# Altium footprint library master.PcbLib: 98 footprints (part 7 of 7)
Each footprint in its own frame and in the unit in brackets; x right, y up, seen from the top. Pads: shape width x height; smd on the part's side, far side on the other; paste and mask are expansions set on the pad; w line width, h text height; cw(c..) or ccw(c..) is an arc to the next point about the centre after c.
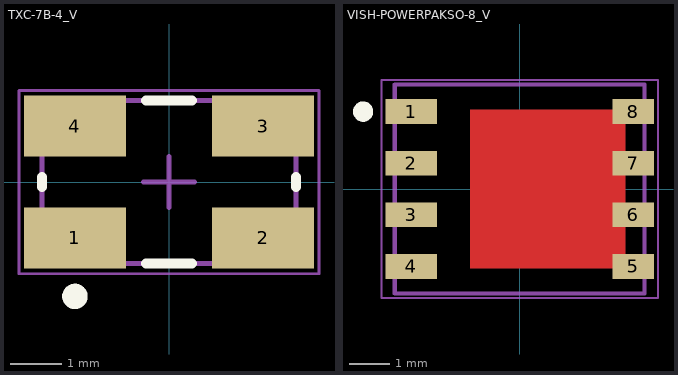
[diagram p6: the footprints below, top view; thin cyan lines are the x and y axes]

## TXC-7B-4_V [mm] "SMD, 4-Leads, Body 5x3.2mm, Pitch 3.7mm"
height 1.05
pads (4):
  rect 2x1.2 smd: 1(-1.85,-1.1) 2(1.85,-1.1) 3(1.85,1.1) 4(-1.85,1.1)
Top Overlay:
  circle w0.25: c-1.85,-2.25 r0.125
  lines w0.2: -2.5,-0.1 -2.5,0.1 ; -0.45,-1.6 0.45,-1.6 ; -0.45,1.6 0.45,1.6 ; 2.5,-0.1 2.5,0.1
Mechanical 13:
  lines w0.1: -2.5,-1.6 2.5,-1.6 2.5,1.6 -2.5,1.6 -2.5,-1.6
Mechanical 15:
  lines w0.05: -2.95,-1.8 2.95,-1.8 2.95,1.8 -2.95,1.8 -2.95,-1.8
  lines w0.1: -0.5,0 0.5,0 ; 0,-0.5 0,0.5
3D body: height 1.05, standoff 0, extent -2.5,-1.6 2.5,1.6

## VISH-POWERPAKSO-8_V [mm] "SMD, 8-Leads, Body 6.15x5.155mm, Pitch 1.27mm"
height 1.12
pads (8):
  rect 1.27x0.61 smd: 1(-2.67,1.905) 2(-2.67,0.635) 3(-2.67,-0.635) 4(-2.67,-1.905)
  rect 1.02x0.61 smd: 5(2.795,-1.905) 6(2.795,-0.635) 7(2.795,0.635) 8(2.795,1.905)
Top Layer:
  region: -1.215,-1.955 2.595,-1.955 2.595,1.955 -1.215,1.955
Top Overlay:
  circle w0.25: c-3.855,1.905 r0.125
Mechanical 13:
  lines w0.1: -3.075,-2.578 -3.075,2.578 3.075,2.578 3.075,-2.578 -3.075,-2.578
Mechanical 15:
  lines w0.05: -3.405,-2.678 -3.405,2.678 3.405,2.678 3.405,-2.678 -3.405,-2.678
  lines w0.1: -0.5,0 0.5,0 ; 0,-0.5 0,0.5
3D body: height 1.12, standoff 0, extent -3.075,-2.578 3.075,2.578